# Altium footprint library Footprints.PcbLib: 196 footprints (part 9 of 13)
Each footprint in its own frame and in the unit in brackets; x right, y up, seen from the top. Pads: shape width x height; smd on the part's side, far side on the other; paste and mask are expansions set on the pad; w line width, h text height; cw(c..) or ccw(c..) is an arc to the next point about the centre after c.
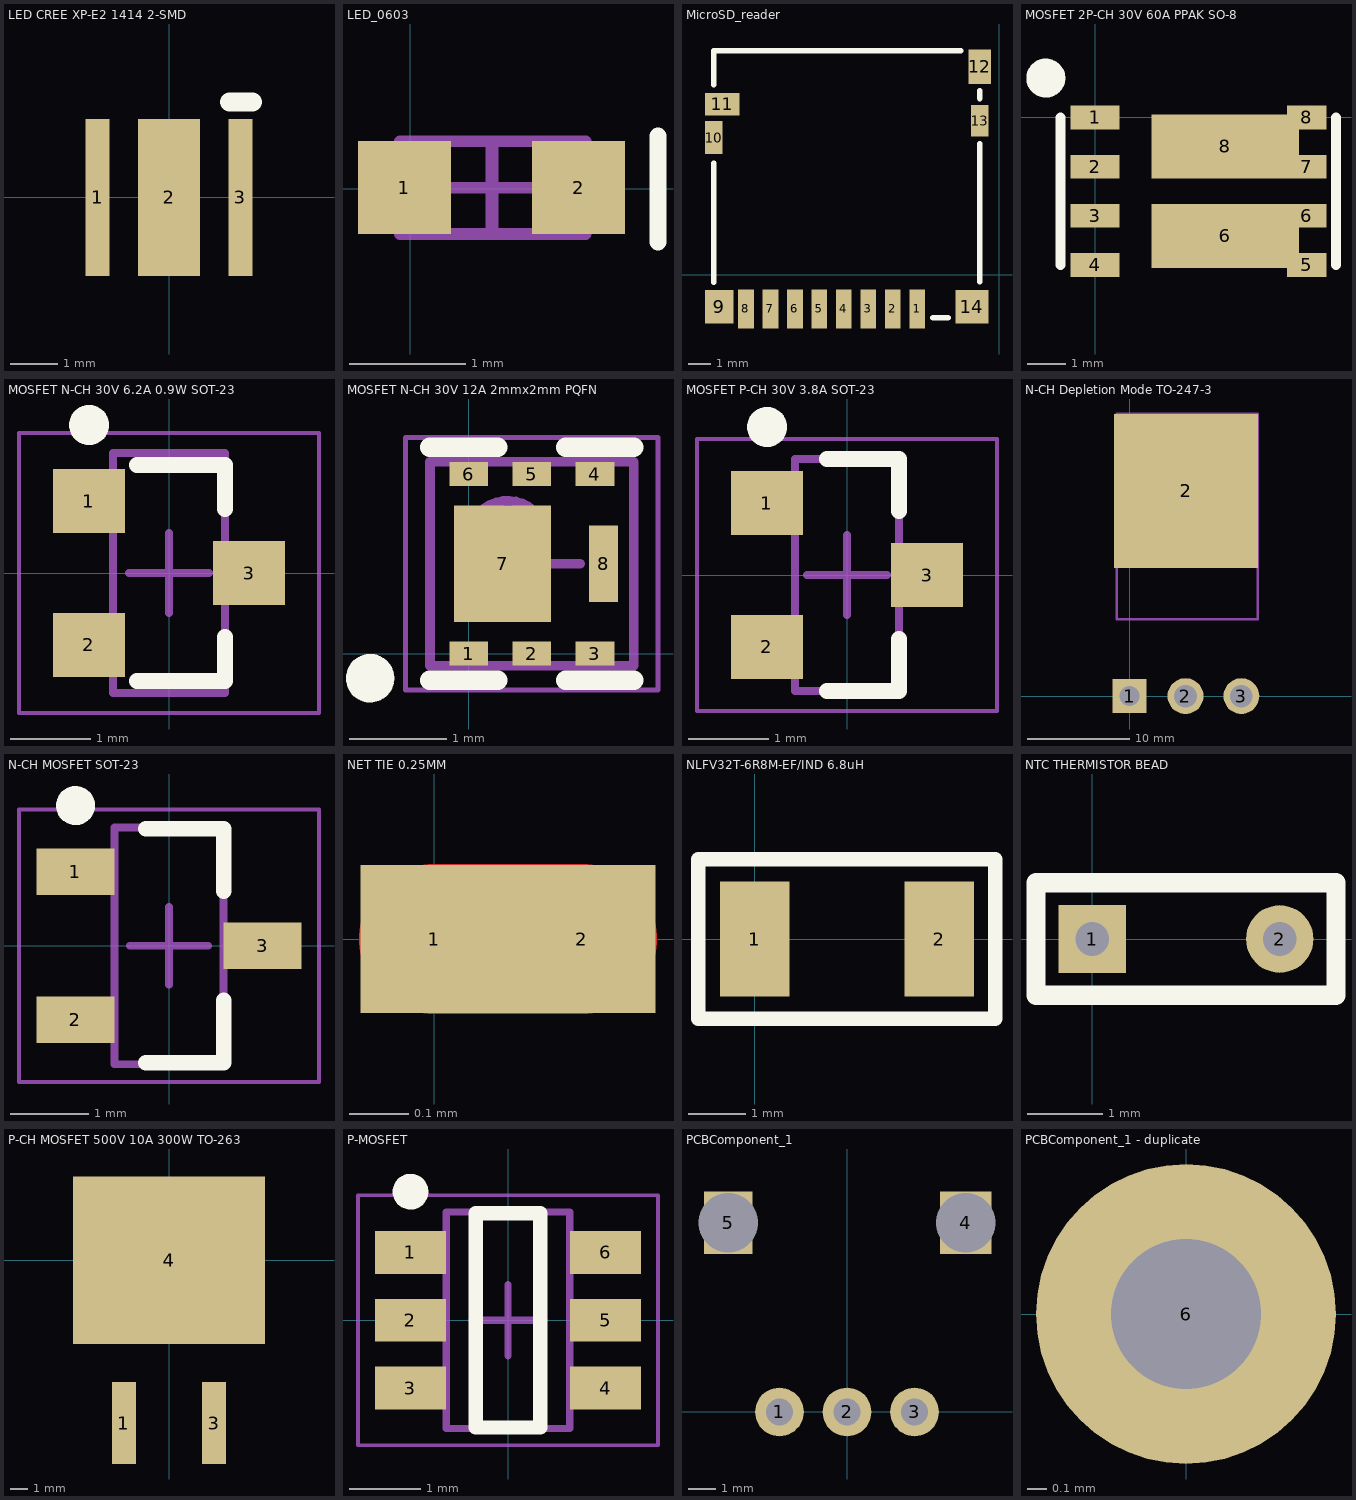
[diagram p8: the footprints below, top view; thin cyan lines are the x and y axes]

## LED CREE XP-E2 1414 2-SMD [mm]
pads (3):
  rect 0.5x3.3 smd: 1(-1.5,0) 3(1.5,0)
  rect 1.3x3.3 smd: 2(0,0)
Top Overlay:
  lines w0.4: 1.275,2 1.75,2
3D body "XLamp_XPG2_3D_STEP.stp": height 2.28, standoff 0.02, extent -1.725,-1.725 1.725,1.725

## LED_0603 [mm]
pads (2):
  rect 0.8x0.8 smd: 1(-0.05,0.01) 2(1.45,0.01)
Top Overlay:
  lines w0.15: 2.134,-0.457 2.134,0.453
Mechanical 13:
  rectangle: 1.296,-0.39 1.511,0.41
  lines w0.1: -0.089,-0.39 -0.089,0.41 1.511,0.41 1.511,-0.39 -0.089,-0.39
Mechanical 15:
  lines w0.1: 0.3,0.01 1.1,0.01 ; 0.311,0.01 1.111,0.01 ; 0.7,-0.39 0.7,0.41 ; 0.711,-0.39 0.711,0.41
3D body: height 0.8, standoff 0.3, extent 0.203,-0.295 1.219,0.315
3D body: height 0.3, standoff 0, extent -0.089,-0.39 1.511,0.41

## MicroSD_reader [mm]
pads (14):
  rect 0.7x1.75 smd: 1(-3.686,-1.534) 2(-4.786,-1.534) 3(-5.886,-1.534) 4(-6.986,-1.534) 5(-8.086,-1.534) 6(-9.186,-1.534) 7(-10.286,-1.534) 8(-11.386,-1.534)
  rect 1.3x1.5 smd: 9(-12.586,-1.434)
  rect 0.8x1.5 smd: 10(-12.836,6.166)
  rect 1.55x1 smd: 11(-12.461,7.666)
  rect 1x1.55 smd: 12(-0.886,9.341)
  rect 0.8x1.4 smd: 13(-0.886,6.916)
  rect 1.5x1.5 smd: 14(-1.236,-1.434)
Top Overlay:
  lines w0.254: -12.836,-0.334 -12.836,5.016 ; -12.836,8.541 -12.836,10.066 -5.111,10.066 -1.736,10.066 ; -2.986,-1.934 -2.311,-1.934 ; -0.886,-0.309 -0.886,5.891 ; -0.886,7.916 -0.886,8.266 ; -12.836,5.016 -12.836,5.016 ; -12.836,5.016 -12.836,5.016

## MOSFET 2P-CH 30V 60A PPAK SO-8 [mm] "Mosfet Array 2 P-Channel (Dual) 30V 60A 46W Surface Mount PowerPAK?SO-8 Dual"
height 1.12
pads (10):
  rect 1.27x0.61 smd: 1(0,0) 2(0,-1.27) 3(0,-2.54) 4(0,-3.81)
  rect 1.02x0.61 smd: 5(5.465,-3.81) 6(5.465,-2.54) 7(5.465,-1.27) 8(5.465,0)
  rect 3.81x1.65 smd: 6(3.36,-3.06) 8(3.36,-0.75)
Top Overlay:
  circle w0.5: c-1.27,1.016 r0.254
  lines w0.254: -0.889,-3.81 -0.889,0 ; 6.223,-3.81 6.223,0
3D body: height 1.2, standoff 0, extent -0.762,-4.318 6.096,0.508

## MOSFET N-CH 30V 6.2A 0.9W SOT-23 [mm] "SOT23, 3-Leads, Body 2.90x2.40mm, Pitch 0.90mm, IPC Medium Density"
height 1.1
pads (3):
  rect 0.9x0.8 smd: 1(-1,0.9) 2(-1,-0.9) 3(1,0)
Top Overlay:
  circle w0.25: c-1,1.85 r0.125
  lines w0.2: -0.4,-1.35 0.7,-1.35 0.7,-0.8 ; -0.4,1.35 0.7,1.35 0.7,0.8
Mechanical 13:
  lines w0.1: -0.7,-1.5 -0.7,1.5 0.7,1.5 0.7,-1.5 -0.7,-1.5
Mechanical 15:
  lines w0.05: -1.875,-1.75 -1.875,1.75 1.875,1.75 1.875,-1.75 -1.875,-1.75
  lines w0.1: -0.5,0 0.5,0 ; 0,-0.5 0,0.5
3D body "MOSFET N-CH 30V.step": height 1.1, standoff 0, extent -1.25,-1.5 1.25,1.5

## MOSFET N-CH 30V 12A 2mmx2mm PQFN [mm] "PQFN, 6-Leads, Body 2.00x2.00mm, Pitch 0.65mm/0.50mm, Thermal Pad 1.00x1.20mm, IPC Medium Density"
height 1
pads (8):
  rect 0.4x0.25 smd: 1(0,0) 2(0.65,0) 3(1.3,0) 4(1.3,1.85) 5(0.65,1.85) 6(0,1.85)
  rect 1x1.2 smd: 7(0.35,0.925)
  rect 0.3x0.79 smd: 8(1.39,0.925)
Top Overlay:
  circle w0.25: c-1.016,-0.254 r0.125
  lines w0.2: -0.4,-0.275 0.3,-0.275 ; -0.4,2.125 0.3,2.125 ; 1,-0.275 1.7,-0.275 ; 1,2.125 1.7,2.125
Mechanical 13:
  circle w0.1: c0.4,1.175 r0.4
  lines w0.1: -0.4,-0.125 1.7,-0.125 1.7,1.975 -0.4,1.975 -0.4,-0.125
Mechanical 15:
  lines w0.05: -0.65,-0.375 1.95,-0.375 1.95,2.225 -0.65,2.225 -0.65,-0.375
  lines w0.1: 0.15,0.925 1.15,0.925 ; 0.65,0.425 0.65,1.425
3D body "MOSFET N-CH 30V 12A 2mmx2mm PQFN.step": height 1, standoff 0, extent -0.4,-0.125 1.7,1.975

## MOSFET P-CH 30V 3.8A SOT-23 [mm] "SOT23, 3-Leads, Body 2.85x2.40mm, Pitch 0.90mm, IPC Medium Density"
height 1.1
pads (3):
  rect 0.9x0.8 smd: 1(-1,0.9) 2(-1,-0.9) 3(1,0)
Top Overlay:
  circle w0.25: c-1,1.85 r0.125
  lines w0.2: -0.25,-1.45 0.65,-1.45 0.65,-0.8 ; -0.25,1.45 0.65,1.45 0.65,0.8
Mechanical 13:
  lines w0.1: -0.65,-1.45 -0.65,1.45 0.65,1.45 0.65,-1.45 -0.65,-1.45
Mechanical 15:
  lines w0.05: -1.875,-1.7 -1.875,1.7 1.875,1.7 1.875,-1.7 -1.875,-1.7
  lines w0.1: -0.5,0 0.5,0 ; 0,-0.5 0,0.5
3D body "MOSFET P-CH 30V 3.8A SOT-23.step": height 1.1, standoff 0, extent -1.25,-1.45 1.25,1.45

## N-CH Depletion Mode TO-247-3 [mm]
pads (4):
  rect 3.3x3.3 hole 1.95: 1(0,0)
  round 3.5 hole 2.2: 2(5.45,0) 3(10.9,0)
  rect 14x15 smd: 2(5.5,20)
Mechanical 1:
  lines w0.254: -1.25,7.5 12.5,7.5 12.5,27.5 -1.25,27.5 -1.25,7.5
3D body "TO-247AC-HB.stp": height 5.3, standoff -4.3, extent -2.5,-0.5 13.35,28.285
3D body: height 30.47, standoff -5.5, extent 10.88,0 10.88,0
3D body: height 33.5, standoff -5.5, extent 10.88,0 10.88,0

## N-CH MOSFET SOT-23 [mm] "SI2318CDS-T1-GE3CT-ND"
height 1.12
pads (3):
  rect 1x0.6 smd: 1(-1.2,0.95) 2(-1.2,-0.95) 3(1.2,0)
Top Overlay:
  circle w0.25: c-1.2,1.8 r0.125
  lines w0.2: -0.3,-1.5 0.7,-1.5 0.7,-0.7 ; -0.3,1.5 0.7,1.5 0.7,0.7
Mechanical 13:
  lines w0.1: -0.7,-1.52 -0.7,1.52 0.7,1.52 0.7,-1.52 -0.7,-1.52
Mechanical 15:
  lines w0.05: -1.925,-1.75 -1.925,1.75 1.925,1.75 1.925,-1.75 -1.925,-1.75
  lines w0.1: -0.5,0 0.5,0 ; 0,-0.5 0,0.5
3D body: height 1.12, standoff 0.1, extent -0.7,-1.52 0.7,1.52

## NET TIE 0.25MM [mm]
pads (2):
  rect 0.25x0.25 smd mask+0: 1(0,0) 2(0.25,0)
Top Layer:
  lines w0.254: 0,0 0.25,0

## NLFV32T-6R8M-EF/IND 6.8uH [mm]
pads (2):
  rect 1.2x2 smd: 1(0,0) 2(3.2,0)
Top Overlay:
  lines w0.254: -0.98,-1.38 4.17,-1.38 4.17,1.38 -0.98,1.38 -0.98,-1.38
3D body: height 2.2, standoff 0, extent -0.979,-1.379 4.169,1.379

## NTC THERMISTOR BEAD [mm] "NTC Thermistor 10k Bead"
pads (2):
  rect 0.9x0.9 hole 0.45: 1(0,0)
  round 0.9 hole 0.45: 2(2.5,0)
Top Overlay:
  lines w0.254: -0.75,-0.75 3.25,-0.75 3.25,0.75 -0.75,0.75 -0.75,-0.75

## P-CH MOSFET 500V 10A 300W TO-263 [mm]
pads (3):
  rect 1.35x4.6 smd: 1(-2.54,-9.15) 3(2.54,-9.15)
  rect 10.8x9.4 smd: 4(0,0)
3D body "to-263.STEP": height 4.3, standoff 0, extent -5,-11.19 5,4.69

## P-MOSFET [mm] "SOT23, 6-Leads, Body 2.93x2.80mm, Pitch 0.95mm, IPC Medium Density"
height 1.25
pads (6):
  rect 1x0.6 smd mask+0.076: 1(-1.365,0.95) 2(-1.365,0) 3(-1.365,-0.95) 4(1.365,-0.95) 5(1.365,0) 6(1.365,0.95)
Top Overlay:
  circle w0.25: c-1.365,1.8 r0.125
  lines w0.2: -0.45,-1.5 -0.45,1.5 0.45,1.5 0.45,-1.5 -0.45,-1.5
Mechanical 13:
  lines w0.1: -0.865,-1.515 0.865,-1.515 0.865,1.515 -0.865,1.515 -0.865,-1.515
Mechanical 15:
  lines w0.05: -2.1,-1.75 2.1,-1.75 2.1,1.75 -2.1,1.75 -2.1,-1.75
  lines w0.1: -0.5,0 0.5,0 ; 0,-0.5 0,0.5
3D body "P-MOSFET.step": height 1.25, standoff 0, extent -1.5,-1.515 1.5,1.515

## PCBComponent_1 [mm]
pads (5):
  round 1.8 hole 1: 1(-2.5,0) 2(0,0) 3(2.5,0)
  rect 1.9x2.3 hole 2.2 square: 4(4.4,7)
  rect 1.8x2.3 hole 2.2 square: 5(-4.4,7)
3D body "ptv09a-4x15f-xxxx.stp": height 7.15, standoff -5.5, extent -5.7,-3.5 5.7,15.487

## PCBComponent_1 - duplicate [mil]
pads (1):
  round 60 hole 30: 6(0,0)